# Altium footprint library Sajad_Altium_Library.PcbLib: 333 footprints (part 19 of 21)
Each footprint in its own frame and in the unit in brackets; x right, y up, seen from the top. Pads: shape width x height; smd on the part's side, far side on the other; paste and mask are expansions set on the pad; w line width, h text height; cw(c..) or ccw(c..) is an arc to the next point about the centre after c.
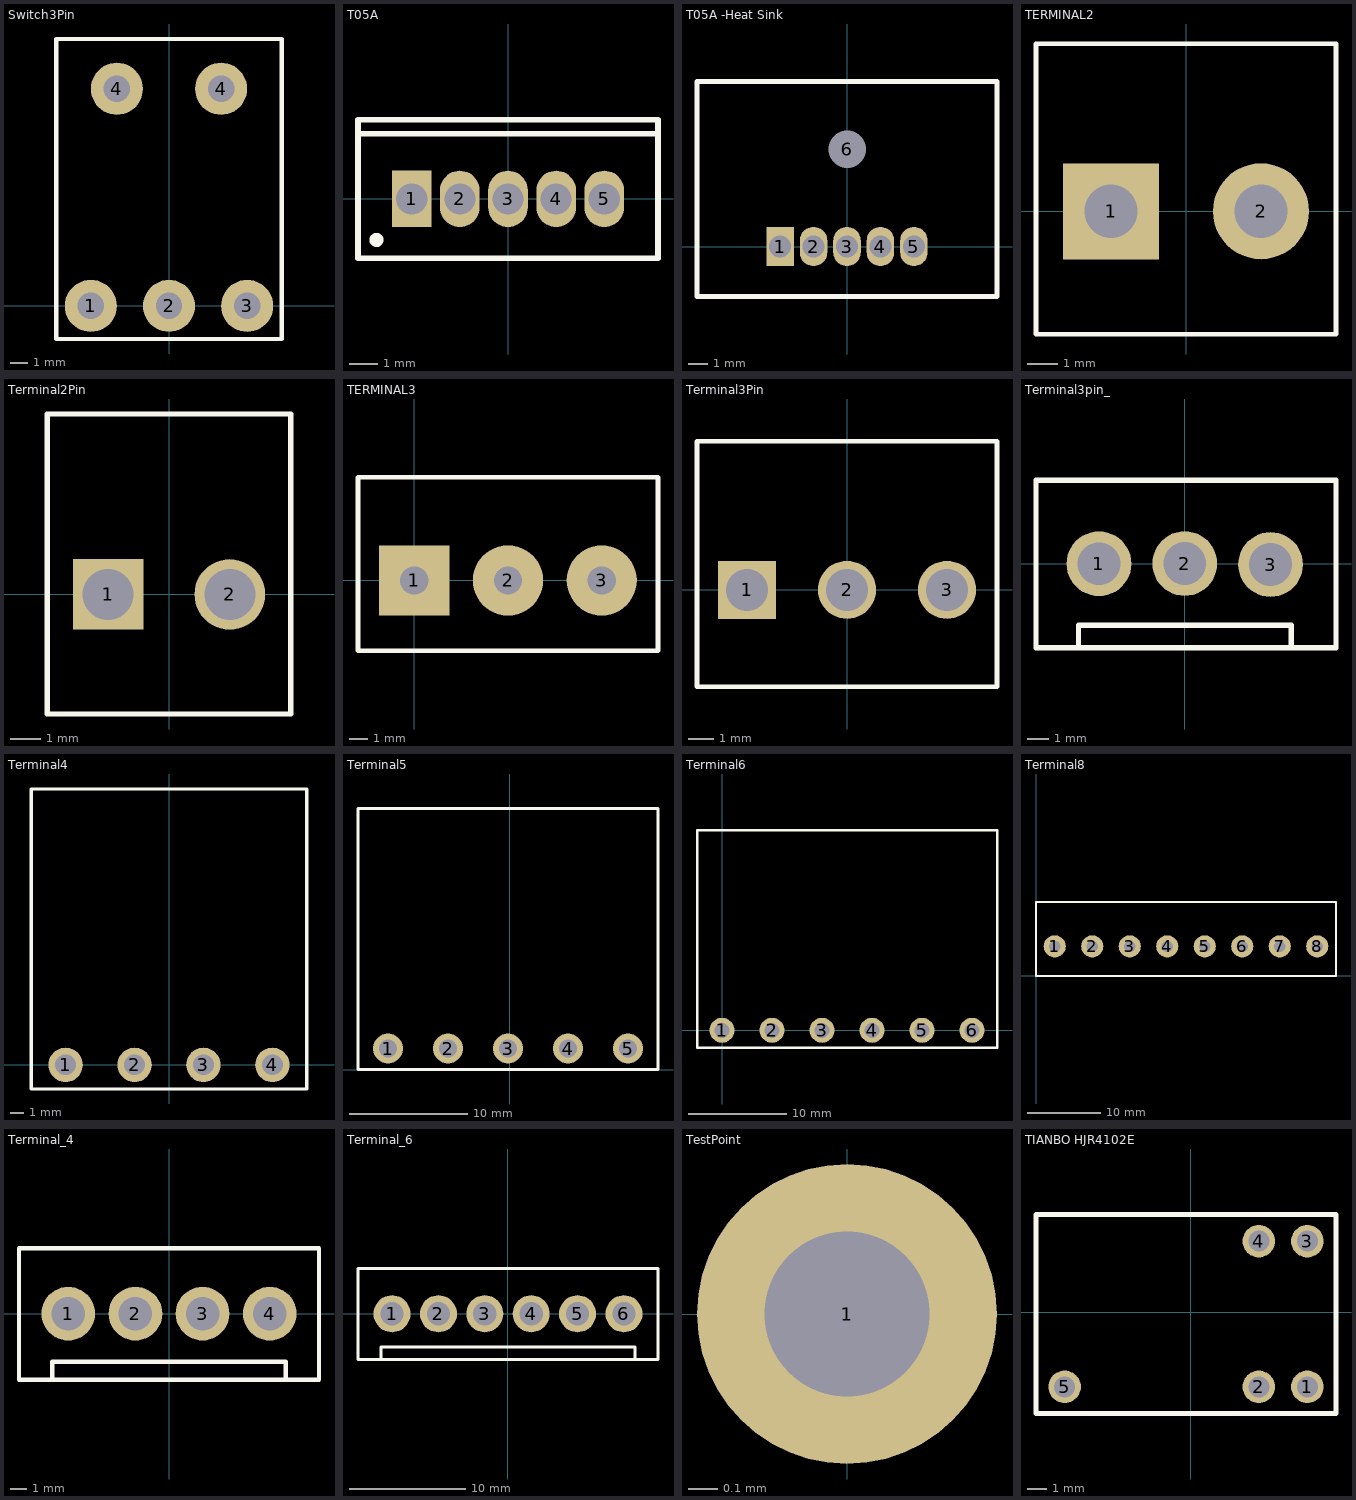
[diagram p18: the footprints below, top view; thin cyan lines are the x and y axes]

## Switch3Pin [mm]
pads (5):
  round 3 hole 1.524: 1(-4.5,0) 2(0,0) 3(4.5,0) 4(-3,12.5) 4(3,12.5)
Top Overlay:
  lines w0.254: -6.5,-1.905 6.5,-1.905 6.5,15.367 -6.5,15.367 -6.5,-1.905

## T05A [mm] "TO, Thru-Hole, Vertical, Heatsink Mounted; 5 In-Line Leads; Pitch 1.70 mm"
height 19.6
pads (5):
  rect 1.4x2 hole 1.1: 1(-3.4,0)
  oval 1.4x2 hole 1.1: 2(-1.7,0) 3(0,0) 4(1.7,0) 5(3.4,0)
Top Overlay:
  circle w0.25: c-4.65,-1.45 r0.125
  lines w0.2: -5.3,2.3 5.3,2.3 ; -5.3,-2.1 5.3,-2.1 5.3,2.8 -5.3,2.8 -5.3,-2.1
Mechanical 13:
  lines w0.1: -5.3,2.3 5.3,2.3 ; -5.3,-2.1 -5.3,2.8 5.3,2.8 5.3,-2.1 -5.3,-2.1 ; -3.91,-0.28 -3.91,0.28 -2.89,0.28 -2.89,-0.28 -3.91,-0.28 ; -2.21,-0.28 -2.21,0.28 -1.19,0.28 -1.19,-0.28 -2.21,-0.28 ; -0.51,-0.28 -0.51,0.28 0.51,0.28 0.51,-0.28 -0.51,-0.28 ; 1.19,-0.28 1.19,0.28 2.21,0.28 2.21,-0.28 1.19,-0.28 ; 2.89,-0.28 2.89,0.28 3.91,0.28 3.91,-0.28 2.89,-0.28
Mechanical 15:
  lines w0.1: -0.5,0 0.5,0 ; 0,-0.5 0,0.5
3D body: height 17, standoff -10.82, extent -5.08,-2.359 5.08,2.591

## T05A -Heat Sink [mm] "TO, Thru-Hole, Vertical, Heatsink Mounted; 5 In-Line Leads; Pitch 1.70 mm"
height 19.6
pads (6):
  rect 1.4x2 hole 1.1: 1(-3.4,0)
  oval 1.4x2 hole 1.1: 2(-1.7,0) 3(0,0) 4(1.7,0) 5(3.4,0)
  round 1.778 hole 1.905: 6(0,4.953)
Top Overlay:
  lines w0.254: -7.62,-2.54 -4.953,-2.54 4.826,-2.54 7.62,-2.54 7.62,8.382 -7.62,8.382 -7.62,4.953 -7.62,-2.54
Mechanical 13:
  lines w0.1: -3.91,-0.28 -2.89,-0.28 -2.89,0.28 -3.91,0.28 -3.91,-0.28 ; -2.21,-0.28 -1.19,-0.28 -1.19,0.28 -2.21,0.28 -2.21,-0.28 ; -0.51,-0.28 0.51,-0.28 0.51,0.28 -0.51,0.28 -0.51,-0.28 ; 1.19,-0.28 2.21,-0.28 2.21,0.28 1.19,0.28 1.19,-0.28 ; 2.89,-0.28 3.91,-0.28 3.91,0.28 2.89,0.28 2.89,-0.28
Mechanical 15:
  lines w0.1: -0.5,0 0.5,0 ; 0,-0.5 0,0.5
3D body: height 25, standoff -3.8, extent -7.391,-2.48 7.391,8.322
3D body: height 20.8, standoff -7.98, extent -4.95,-2.159 4.95,2.341

## TERMINAL2 [mm]
pads (2):
  rect 3.2x3.2 hole 1.778: 1(-2.5,0)
  round 3.2 hole 1.778: 2(2.5,0)
Top Overlay:
  lines w0.152: -5,-4.1 5,-4.1 5,5.588 -5,5.588 -5,-4.1
3D body: height 10, standoff -4.16, extent -5.427,-3.429 5.173,4.171

## Terminal2Pin [mil]
pads (2):
  rect 90x90 hole 65: 1(-77.5,0)
  round 90 hole 65: 2(77.5,0)
Top Overlay:
  lines w7: -155,-152.5 155,-152.5 155,230 -155,230 -155,-152.5
3D body: height 334.65, standoff -137.8, extent -147.64,-148.4 147.64,139

## TERMINAL3 [mil]
pads (3):
  rect 150x150 hole 60: 1(0,0)
  round 150 hole 60: 2(200,0) 3(400,0)
Top Overlay:
  lines w10: -120,-150 -120,220 520,220 520,-150 -120,-150

## Terminal3Pin [mil]
pads (3):
  rect 90x90 hole 65: 1(-155,0)
  round 90 hole 65: 2(0,0) 3(155,0)
Top Overlay:
  lines w7: -232.5,-150 232.5,-150 232.5,230 -232.5,230 -232.5,-150
3D body: height 334.65, standoff -137.8, extent -147.64,-148.4 147.64,139

## Terminal3pin_ [mm]
pads (3):
  round 3.02 hole 2: 1(-4,-0.006) 2(0,0) 3(4,-0.044)
Top Overlay:
  lines w0.254: -4.953,-3.931 -4.953,-2.864 4.966,-2.864 4.953,-3.931 ; -6.934,-3.931 7.036,-3.931 7.048,-3.918 7.048,3.893 -6.934,3.893 -6.934,-3.931

## Terminal4 [mil] "Terminal 4 pin"
pads (4):
  round 100 hole 60: 1(-300,0) 2(-100,0) 3(100,0) 4(300,0)
Top Overlay:
  lines w10: -400,-70 -400,800 400,800 400,-70 -400,-70
3D body: height 332.68, standoff -165.35, extent -439.37,0 439.37,472.44

## Terminal5 [mil] "Terminal 5 pin"
pads (5):
  round 100 hole 60: 1(-405,70) 2(-205,70) 3(-5,70) 4(195,70) 5(395,70)
Top Overlay:
  lines w10: -505,0 495,0 495,870 -505,870 -505,0

## Terminal6 [mil] "Terminal 6 pin"
pads (6):
  round 100 hole 60: 1(0,0) 2(200,0) 3(400,0) 4(600,0) 5(800,0) 6(1000,0)
Top Overlay:
  lines w10: -100,-70 -100,800 900,800 1100,800 1100,-70 900,-70 -100,-70

## Terminal8 [mm] "Terminal 8 pin"
pads (8):
  round 3 hole 1.524: 1(2.54,4) 2(7.62,4) 3(12.7,4) 4(17.78,4) 5(22.86,4) 6(27.94,4) 7(33.02,4) 8(38.1,4)
Top Overlay:
  lines w0.254: 0,0 40.64,0 40.64,10 0,10 0,0

## Terminal_4 [mm] "Terminal 4 pin"
pads (4):
  round 3.2 hole 2: 1(-6,0) 2(-2,0) 3(2,0) 4(6,0)
Top Overlay:
  lines w0.254: -8.934,-3.931 -8.934,3.893 ; -8.934,-3.931 -8.934,3.893 ; -8.934,-3.931 8.934,-3.931 ; -8.934,3.893 8.934,3.893 ; -6.953,-2.864 -6.953,-3.931 -6.953,-2.864 ; -6.953,-2.864 6.953,-2.864 ; 6.953,-2.864 6.953,-3.931 6.953,-2.864 ; 8.934,-3.931 8.934,3.893 ; 8.934,-3.931 8.934,3.893

## Terminal_6 [mm] "Terminal 6 pin"
pads (6):
  round 3.2 hole 2: 1(-10,0) 2(-6,0) 3(-2,0) 4(2,0) 5(6,0) 6(10,0)
Top Overlay:
  lines w0.254: 10.953,-3.931 10.953,-2.864 -10.953,-2.864 ; -12.934,-3.931 -12.934,3.893 ; -12.934,-3.931 -12.934,3.893 ; -12.934,-3.931 12.934,-3.931 12.934,3.893 -12.934,3.893 ; -10.953,-2.864 -10.953,-3.931 -10.953,-2.864

## TestPoint [mil] "TestPoint"
pads (1):
  round 40 hole 22: 1(0,0)

## TIANBO HJR4102E [mm] "TIANBO HJR4102E 12 v 3 A relay"
pads (5):
  round 1.7 hole 1.1: 1(6.099,-3.912) 2(3.559,-3.912) 3(6.099,3.708) 4(3.559,3.708) 5(-6.601,-3.912)
Top Overlay:
  lines w0.254: -8.101,-5.302 7.599,-5.302 7.599,5.098 -8.101,5.098 -8.101,-5.302